# Altium footprint library mastermind.PCBLIB: 1061 footprints (part 54 of 67)
Each footprint in its own frame and in the unit in brackets; x right, y up, seen from the top. Pads: shape width x height; smd on the part's side, far side on the other; paste and mask are expansions set on the pad; w line width, h text height; cw(c..) or ccw(c..) is an arc to the next point about the centre after c.
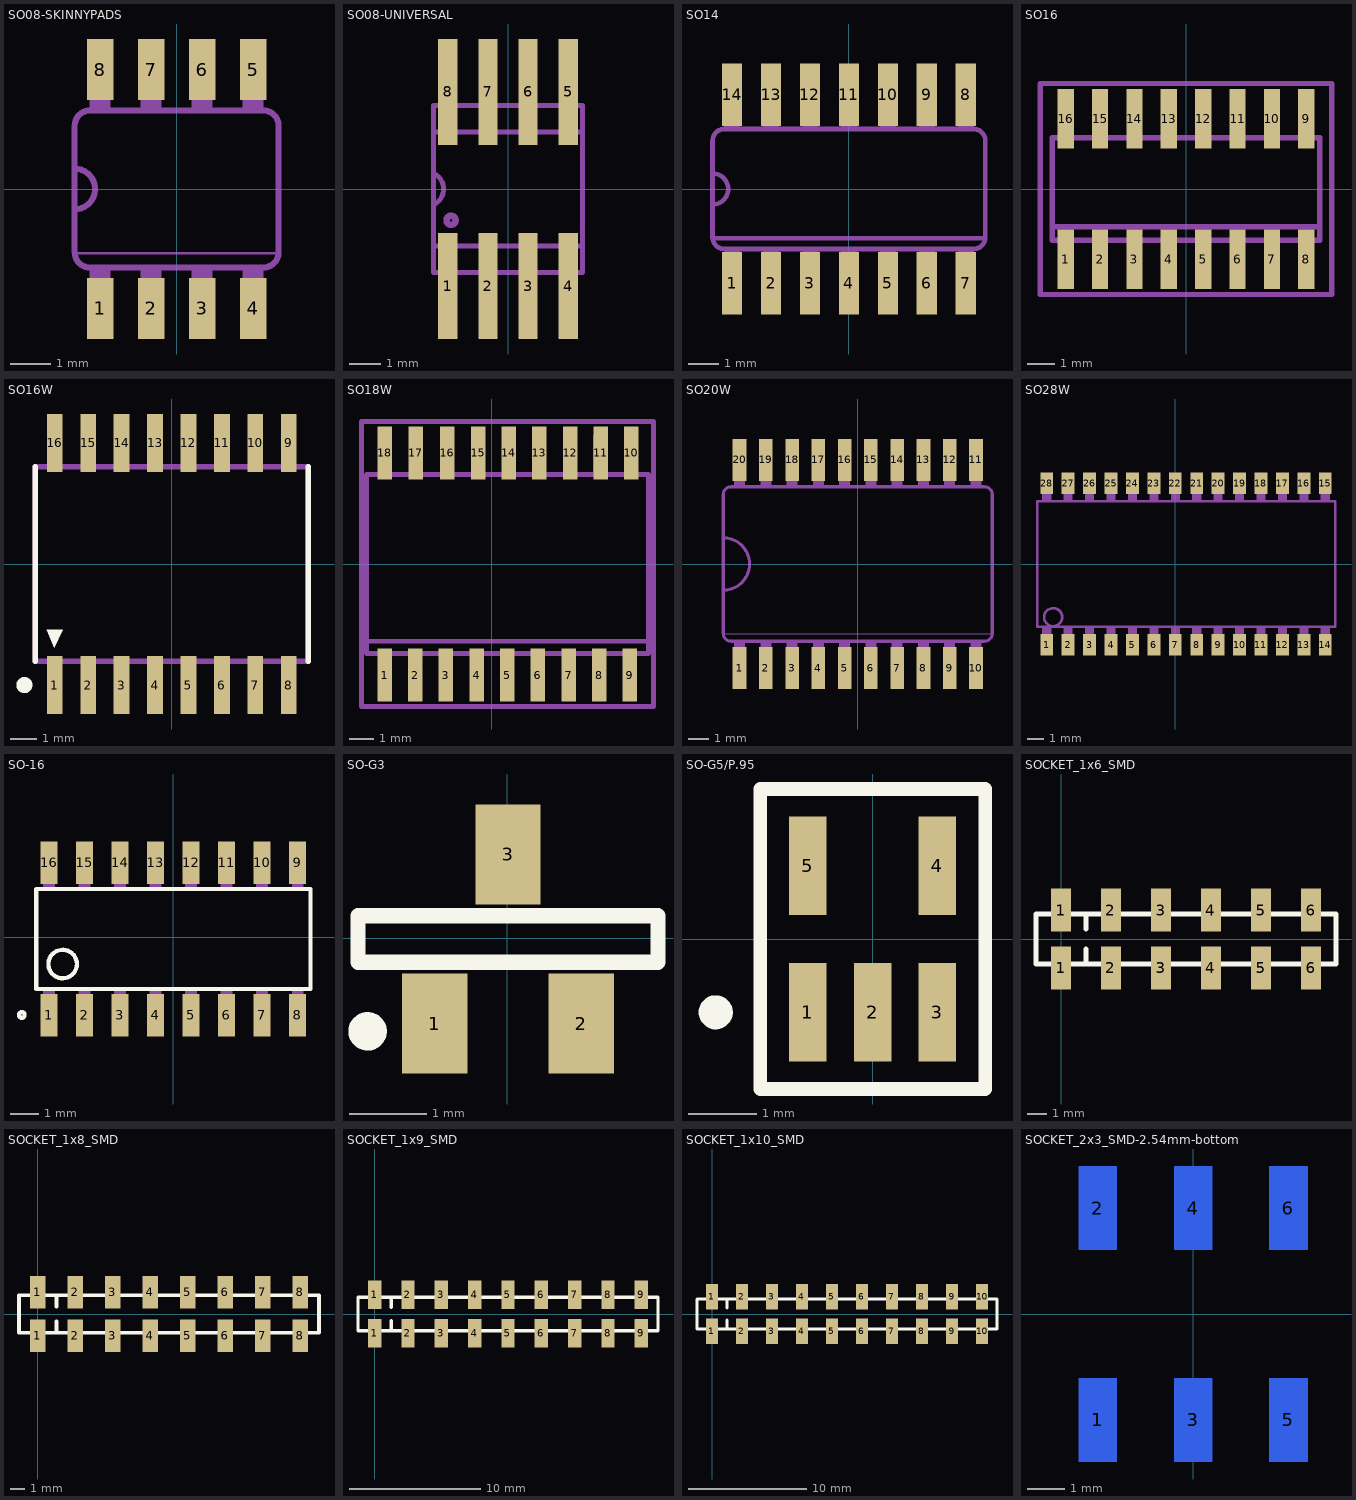
[diagram p53: the footprints below, top view; thin cyan lines are the x and y axes]

## SO08-SKINNYPADS [mil]
pads (8):
  rect 26x60 smd: 1(-75,-117.06) 2(-25,-117.06) 3(25,-117.06) 4(75,-117.06) 5(75,117.06) 6(25,117.06) 7(-25,117.06) 8(-75,117.06)
Mechanical 2:
  lines w2: -100,-63 100,-63
  lines w6: -100,-20 ccw(c-100,0) -100,20 ; -100,-62 ccw(c-85,-62) -85,-77 85,-77 ccw(c85,-62) 100,-62 100,62 ccw(c85,62) 85,77 -85,77 ccw(c-85,62) -100,62 -100,-62
Mechanical 8:
  region: -85,77 -85,122 -65,122 -65,77
  region: -35,77 -35,122 -15,122 -15,77
  region: 15,77 15,122 35,122 35,77
  region: 65,-122 65,-77 85,-77 85,-122
  region: 15,-121 15,-76 35,-76 35,-121
  region: -35,-122 -35,-77 -15,-77 -15,-122
  region: -85,-122 -85,-77 -65,-77 -65,-122
  region: 65,77 65,122 85,122 85,77

## SO08-UNIVERSAL [mil] "SO08-UNIVERSAL"
pads (8):
  rect 24x132 smd: 1(-75,-121) 2(-25,-121) 3(25,-121) 4(75,-121) 5(75,121) 6(25,121) 7(-25,121) 8(-75,121)
Mechanical 3:
  region: 68,73 68,157 82,157 82,73
  region: 18,73 18,157 32,157 32,73
  region: -32,73 -32,157 -18,157 -18,73
  region: -82,73 -82,157 -68,157 -68,73
  region: 68,-157 68,-73 82,-73 82,-157
  region: 18,-157 18,-73 32,-73 32,-157
  region: -32,-157 -32,-73 -18,-73 -18,-157
  region: -82,-157 -82,-73 -68,-73 -68,-157
  lines w6: -92.99,70.98 92.99,70.98 ; -92.99,-70.98 -92.99,-104 92.99,-104 92.99,-70.98 ; -92.99,-70.98 -92.99,104 92.99,104 92.99,-70.98 ; -92.99,-70.98 92.99,-70.98
Dimensions:
  circle w8: c-71,-39 r5.65
  lines w6: -92.99,-70.98 -92.99,-19.57 ; -92.99,19.57 -92.99,70.98 ; -92.52,-19.69 ccw(c-102.36,0) -92.52,19.69 ; -57.09,-70.87 -43.31,-70.87 ; -57.09,70.87 -43.31,70.87 ; -7.87,-70.87 7.87,-70.87 ; -7.87,70.87 7.87,70.87 ; 43.31,-70.87 57.09,-70.87 ; 43.31,70.87 57.09,70.87 ; 92.99,-70.98 92.99,70.98
3D body: height 50, standoff 0, extent -87,55 -63,187
3D body: height 50, standoff 0, extent -37,55 -13,187
3D body: height 50, standoff 0, extent 13,55 37,187
3D body: height 50, standoff 0, extent 63,55 87,187
3D body: height 50, standoff 0, extent 63,-187 87,-55
3D body: height 50, standoff 0, extent 13,-187 37,-55
3D body: height 50, standoff 0, extent -37,-187 -13,-55
3D body: height 50, standoff 0, extent -87,-187 -63,-55
3D body: height 150, standoff 0, extent 68,73 82,157
3D body: height 150, standoff 0, extent 18,73 32,157
3D body: height 150, standoff 0, extent -32,73 -18,157
3D body: height 150, standoff 0, extent -82,73 -68,157
3D body: height 150, standoff 0, extent 68,-157 82,-73
3D body: height 150, standoff 0, extent 18,-157 32,-73
3D body: height 150, standoff 0, extent -32,-157 -18,-73
3D body: height 150, standoff 0, extent -82,-157 -68,-73
3D body: height 150, standoff 0, extent 89.74,-107.25 96.24,-67.73
3D body: height 150, standoff 0, extent 89.74,-74.23 96.24,107.25
3D body: height 150, standoff 0, extent -96.24,-107.25 -89.74,-67.73
3D body: height 150, standoff 0, extent -96.24,-74.23 -89.74,107.25
3D body: height 150, standoff 0, extent -96.24,-107.25 96.24,-100.75
3D body: height 150, standoff 0, extent -96.24,100.75 96.24,107.25
3D body: height 150, standoff 0, extent -96.24,67.73 96.24,74.23
3D body: height 150, standoff 0, extent -96.24,-74.23 96.24,-67.73

## SO14 [mil]
pads (14):
  rect 26x80 smd: 1(-150,-121) 2(-100,-121) 3(-50,-121) 4(0,-121) 5(50,-121) 6(100,-121) 7(150,-121) 8(150,121) 9(100,121) 10(50,121) 11(0,121) 12(-50,121) 13(-100,121) 14(-150,121)
Mechanical 2:
  lines w6: -175,-63 175,-63 ; -175,-20 ccw(c-175,0) -175,20 ; -175,-20 -175,20 ; -175,-20 -175,-62 ccw(c-160,-62) -160,-77 160,-77 ccw(c160,-62) 175,-62 175,62 ccw(c160,62) 160,77 -160,77 ccw(c-160,62) -175,62 -175,20
Mechanical 8:
  region: -10,77 -10,122 10,122 10,77
  region: -160,-122 -160,-77 -140,-77 -140,-122
  region: -110,-122 -110,-77 -90,-77 -90,-122
  region: -60,-121 -60,-76 -40,-76 -40,-121
  region: -10,-122 -10,-77 10,-77 10,-122
  region: -60,77 -60,122 -40,122 -40,77
  region: -110,77 -110,122 -90,122 -90,77
  region: -160,77 -160,122 -140,122 -140,77
  region: 40,77 40,122 60,122 60,77
  region: 90,77 90,122 110,122 110,77
  region: 140,77 140,122 160,122 160,77
  region: 40,-122 40,-77 60,-77 60,-122
  region: 90,-122 90,-77 110,-77 110,-122
  region: 140,-122 140,-77 160,-77 160,-122

## SO16 [mm]
pads (16):
  rect 0.6x2.2 smd: 1(-4.445,-2.6) 2(-3.175,-2.6) 3(-1.905,-2.6) 4(-0.635,-2.6) 5(0.635,-2.6) 6(1.905,-2.6) 7(3.175,-2.6) 8(4.445,-2.6) 9(4.445,2.6) 10(3.175,2.6) 11(1.905,2.6) 12(0.635,2.6) 13(-0.635,2.6) 14(-1.905,2.6) 15(-3.175,2.6) 16(-4.445,2.6)
Mechanical 8:
  region: -4.69,2 -4.69,3.1 -4.2,3.1 -4.2,2
  region: -3.42,2 -3.42,3.1 -2.93,3.1 -2.93,2
  region: 2.93,2 2.93,3.1 3.42,3.1 3.42,2
  region: 4.2,2 4.2,3.1 4.69,3.1 4.69,2
  region: 4.2,-3.1 4.2,-2 4.69,-2 4.69,-3.1
  region: 2.93,-3.1 2.93,-2 3.42,-2 3.42,-3.1
  region: 1.66,-3.1 1.66,-2 2.15,-2 2.15,-3.1
  region: 0.39,-3.1 0.39,-2 0.88,-2 0.88,-3.1
  region: -2.15,2 -2.15,3.1 -1.66,3.1 -1.66,2
  region: -0.88,2 -0.88,3.1 -0.39,3.1 -0.39,2
  region: 0.39,2 0.39,3.1 0.88,3.1 0.88,2
  region: 1.66,2 1.66,3.1 2.15,3.1 2.15,2
  region: -0.88,-3.1 -0.88,-2 -0.39,-2 -0.39,-3.1
  region: -2.15,-3.1 -2.15,-2 -1.66,-2 -1.66,-3.1
  region: -3.42,-3.1 -3.42,-2 -2.93,-2 -2.93,-3.1
  region: -4.69,-3.1 -4.69,-2 -4.2,-2 -4.2,-3.1
  lines w0.203: -4.94,-1.4 4.94,-1.4 ; -4.94,-1.4 -4.94,1.9 4.94,1.9 4.94,-1.4 ; -4.94,-1.4 -4.94,-1.9 4.94,-1.9 4.94,-1.4
Mechanical 29 (Mech34):
  lines w0.2: -5.395,-3.9 -5.395,3.9 5.395,3.9 5.395,-3.9 -5.395,-3.9

## SO16W [mm]
pads (16):
  rect 0.6x2.2 smd: 1(-4.445,-4.6) 2(-3.175,-4.6) 3(-1.905,-4.6) 4(-0.635,-4.6) 5(0.635,-4.6) 6(1.905,-4.6) 7(3.175,-4.6) 8(4.445,-4.6) 9(4.445,4.6) 10(3.175,4.6) 11(1.905,4.6) 12(0.635,4.6) 13(-0.635,4.6) 14(-1.905,4.6) 15(-3.175,4.6) 16(-4.445,4.6)
Top Overlay:
  circle w0.3: c-5.6,-4.6 r0.156
  region: -4.745,-2.5 -4.144,-2.5 -4.457,-3.176
  lines w0.2: -5.19,-3.7 -5.19,-0.536 -5.19,3.7 ; 5.19,-3.7 5.19,3.7
Mechanical 13:
  region: -4.2,-5.328 -4.697,-5.328 -4.697,-3.8 -4.2,-3.8
  region: -2.93,-5.33 -3.426,-5.33 -3.426,-3.8 -2.93,-3.8
  region: -1.66,-5.33 -2.154,-5.33 -2.154,-3.8 -1.66,-3.8
  region: -0.39,-5.33 -0.882,-5.33 -0.882,-3.8 -0.39,-3.8
  region: 0.88,-5.326 0.39,-5.326 0.39,-3.8 0.88,-3.8
  region: 2.15,-5.322 1.661,-5.322 1.661,-3.8 2.15,-3.8
  region: 3.42,-5.33 2.935,-5.33 2.935,-3.8 3.42,-3.8
  region: 4.69,-5.322 4.201,-5.322 4.201,-3.8 4.69,-3.8
  region: 4.69,3.803 4.203,3.803 4.203,5.32 4.69,5.32
  region: 3.42,3.803 2.932,3.803 2.932,5.32 3.42,5.32
  region: 2.15,3.804 1.662,3.804 1.662,5.32 2.15,5.32
  region: 0.88,3.803 0.39,3.803 0.39,5.32 0.88,5.32
  region: -0.39,3.801 -0.88,3.801 -0.88,5.32 -0.39,5.32
  region: -1.66,3.804 -2.152,3.804 -2.152,5.32 -1.66,5.32
  region: -2.93,3.805 -3.424,3.805 -3.424,5.32 -2.93,5.32
  region: -4.2,3.806 -4.697,3.806 -4.697,5.32 -4.2,5.32
  lines w0.203: -5.19,-3.7 5.19,-3.7 5.19,-3.2 5.19,3.7 -5.19,3.7 -5.19,-3.2 -5.19,-3.7
3D body "SO16 Wide 7.50mm.step": height 2.65, standoff 0, extent -5.15,-5.25 5.15,5.05

## SO18W [mm]
pads (18):
  rect 0.6x2.2 smd: 1(-4.445,-4.6) 2(-3.175,-4.6) 3(-1.905,-4.6) 4(-0.635,-4.6) 5(0.635,-4.6) 6(1.905,-4.6) 7(3.175,-4.6) 8(4.445,-4.6) 9(5.715,-4.6) 10(5.775,4.6) 11(4.505,4.6) 12(3.235,4.6) 13(1.965,4.6) 14(0.695,4.6) 15(-0.575,4.6) 16(-1.845,4.6) 17(-3.145,4.6) 18(-4.445,4.6)
Mechanical 8:
  region: 5.47,-5.32 5.47,-3.8 5.96,-3.8 5.96,-5.32
  region: -4.69,3.8 -4.69,5.32 -4.2,5.32 -4.2,3.8
  region: -3.39,3.8 -3.39,5.32 -2.9,5.32 -2.9,3.8
  region: -2.12,3.8 -2.12,5.32 -1.63,5.32 -1.63,3.8
  region: -0.85,3.8 -0.85,5.32 -0.36,5.32 -0.36,3.8
  region: 0.42,3.8 0.42,5.32 0.91,5.32 0.91,3.8
  region: 1.69,3.8 1.69,5.32 2.18,5.32 2.18,3.8
  region: 2.96,3.8 2.96,5.32 3.45,5.32 3.45,3.8
  region: 4.2,3.8 4.2,5.32 4.69,5.32 4.69,3.8
  region: 5.47,3.8 5.47,5.32 5.96,5.32 5.96,3.8
  region: 4.2,-5.32 4.2,-3.8 4.69,-3.8 4.69,-5.32
  region: 2.93,-5.32 2.93,-3.8 3.42,-3.8 3.42,-5.32
  region: 1.66,-5.32 1.66,-3.8 2.15,-3.8 2.15,-5.32
  region: 0.39,-5.32 0.39,-3.8 0.88,-3.8 0.88,-5.32
  region: -0.88,-5.32 -0.88,-3.8 -0.39,-3.8 -0.39,-5.32
  region: -2.15,-5.32 -2.15,-3.8 -1.66,-3.8 -1.66,-5.32
  region: -3.42,-5.32 -3.42,-3.8 -2.93,-3.8 -2.93,-5.32
  region: -4.69,-5.32 -4.69,-3.8 -4.2,-3.8 -4.2,-5.32
  lines w0.203: -5.19,-3.2 6.49,-3.2 ; -5.19,-3.2 -5.19,3.7 6.49,3.7 6.49,-3.2 ; -5.19,-3.2 -5.19,-3.7 6.49,-3.7 6.49,-3.2
Mechanical 29 (Mech34):
  lines w0.2: -5.395,-5.9 -5.395,5.9 6.695,5.9 6.695,-5.9 -5.395,-5.9

## SO20W [mil]
pads (20):
  rect 26x80 smd: 1(-225,-198) 2(-175,-198) 3(-125,-198) 4(-75,-198) 5(-25,-198) 6(25,-198) 7(75,-198) 8(125,-198) 9(175,-198) 10(225,-198) 11(225,198) 12(175,198) 13(125,198) 14(75,198) 15(25,198) 16(-25,198) 17(-75,198) 18(-125,198) 19(-175,198) 20(-225,198)
Mechanical 2:
  region: 215,-152 215,-147 235,-147 235,-152
  region: 165,-152 165,-147 185,-147 185,-152
  region: 215,147 215,152 235,152 235,147
  region: 165,147 165,152 185,152 185,147
  region: 115,147 115,152 135,152 135,147
  region: 65,147 65,152 85,152 85,147
  region: 15,147 15,152 35,152 35,147
  region: -35,147 -35,152 -15,152 -15,147
  region: -85,147 -85,152 -65,152 -65,147
  region: -135,147 -135,152 -115,152 -115,147
  region: -185,147 -185,152 -165,152 -165,147
  region: -235,147 -235,152 -215,152 -215,147
  region: 115,-152 115,-147 135,-147 135,-152
  region: 65,-152 65,-147 85,-147 85,-152
  region: 15,-152 15,-147 35,-147 35,-152
  region: -35,-152 -35,-147 -15,-147 -15,-152
  region: -85,-152 -85,-147 -65,-147 -65,-152
  region: -135,-152 -135,-147 -115,-147 -115,-152
  region: -185,-152 -185,-147 -165,-147 -165,-152
  region: -235,-152 -235,-147 -215,-147 -215,-152
  lines w2: -255,-133 255,-133
  lines w6: -256,-50 ccw(c-256,0) -256,50 ; -256,-50 -256,-132 ccw(c-241,-132) -241,-147 241,-147 ccw(c241,-132) 256,-132 256,132 ccw(c241,132) 241,147 -241,147 ccw(c-241,132) -256,132 -256,50 ; -256,-50 -256,50
Mechanical 8:
  region: 215,-210 215,-152 235,-152 235,-210
  region: 165,-210 165,-152 185,-152 185,-210
  region: 215,152 215,210 235,210 235,152
  region: 165,152 165,210 185,210 185,152
  region: 115,152 115,210 135,210 135,152
  region: 65,152 65,210 85,210 85,152
  region: 15,152 15,210 35,210 35,152
  region: -35,152 -35,210 -15,210 -15,152
  region: -85,152 -85,210 -65,210 -65,152
  region: -135,152 -135,210 -115,210 -115,152
  region: -185,152 -185,210 -165,210 -165,152
  region: -235,152 -235,210 -215,210 -215,152
  region: 115,-210 115,-152 135,-152 135,-210
  region: 65,-210 65,-152 85,-152 85,-210
  region: 15,-210 15,-152 35,-152 35,-210
  region: -35,-210 -35,-152 -15,-152 -15,-210
  region: -85,-210 -85,-152 -65,-152 -65,-210
  region: -135,-210 -135,-152 -115,-152 -115,-210
  region: -185,-210 -185,-152 -165,-152 -165,-210
  region: -235,-210 -235,-152 -215,-152 -215,-210

## SO28W [mil]
pads (28):
  rect 30x50 smd: 1(-300,-188.19) 2(-250,-188.19) 3(-200,-188.19) 4(-150,-188.19) 5(-100,-188.19) 6(-50,-188.19) 7(0,-188.19) 8(50,-188.19) 9(100,-188.19) 10(150,-188.19) 11(200,-188.19) 12(250,-188.19) 13(300,-188.19) 14(350,-188.19) 15(350,188.19) 16(300,188.19) 17(250,188.19) 18(200,188.19) 19(150,188.19) 20(100,188.19) 21(50,188.19) 22(0,188.19) 23(-50,188.19) 24(-100,188.19) 25(-150,188.19) 26(-200,188.19) 27(-250,188.19) 28(-300,188.19)
Mechanical 2:
  circle w6: c-285,-124 r21
  lines w6: -322,-146.19 -322,146.19 373,146.19 373,-146.19 -322,-146.19
Mechanical 8:
  region: -310,147.19 -310,207.19 -290,207.19 -290,147.19
  region: -260,147.19 -260,207.19 -240,207.19 -240,147.19
  region: -210,147.19 -210,207.19 -190,207.19 -190,147.19
  region: -160,147.19 -160,207.19 -140,207.19 -140,147.19
  region: -110,147.19 -110,207.19 -90,207.19 -90,147.19
  region: -60,147.19 -60,207.19 -40,207.19 -40,147.19
  region: -10,147.19 -10,207.19 10,207.19 10,147.19
  region: 40,147.19 40,207.19 60,207.19 60,147.19
  region: 90,147.19 90,207.19 110,207.19 110,147.19
  region: 140,147.19 140,207.19 160,207.19 160,147.19
  region: 190,147.19 190,207.19 210,207.19 210,147.19
  region: 240,147.19 240,207.19 260,207.19 260,147.19
  region: 290,147.19 290,207.19 310,207.19 310,147.19
  region: 340,147.19 340,207.19 360,207.19 360,147.19
  region: 340,-207.19 340,-147.19 360,-147.19 360,-207.19
  region: 290,-207.19 290,-147.19 310,-147.19 310,-207.19
  region: 240,-207.19 240,-147.19 260,-147.19 260,-207.19
  region: 190,-207.19 190,-147.19 210,-147.19 210,-207.19
  region: 140,-207.19 140,-147.19 160,-147.19 160,-207.19
  region: 90,-207.19 90,-147.19 110,-147.19 110,-207.19
  region: 40,-207.19 40,-147.19 60,-147.19 60,-207.19
  region: -10,-207.19 -10,-147.19 10,-147.19 10,-207.19
  region: -60,-207.19 -60,-147.19 -40,-147.19 -40,-207.19
  region: -110,-207.19 -110,-147.19 -90,-147.19 -90,-207.19
  region: -160,-207.19 -160,-147.19 -140,-147.19 -140,-207.19
  region: -210,-207.19 -210,-147.19 -190,-147.19 -190,-207.19
  region: -260,-207.19 -260,-147.19 -240,-147.19 -240,-207.19
  region: -310,-207.19 -310,-147.19 -290,-147.19 -290,-207.19

## SO-16 [mil]
pads (16):
  rect 24x60 smd: 1(-175,-110) 2(-125,-110) 3(-75,-110) 4(-25,-110) 5(25,-110) 6(75,-110) 7(125,-110) 8(175,-110) 9(175,105) 10(125,105) 11(75,105) 12(25,105) 13(-25,105) 14(-75,105) 15(-125,105) 16(-175,105)
Top Overlay:
  circle w6: c-213.39,-109.45 r3.94
  circle w6: c-155.91,-37.8 r20.08
  lines w6: -193,-73 -193,68 193,68 193,-73 -193,-73
Mechanical 3:
  region: 167,-114 167,-74 183,-74 183,-114
  region: 117,-114 117,-74 133,-74 133,-114
  region: 67,-114 67,-74 83,-74 83,-114
  region: 17,-114 17,-74 33,-74 33,-114
  region: -33,-114 -33,-74 -17,-74 -17,-114
  region: -83,-114 -83,-74 -67,-74 -67,-114
  region: -133,-114 -133,-74 -117,-74 -117,-114
  region: -183,-114 -183,-74 -167,-74 -167,-114
  region: -183,69 -183,109 -167,109 -167,69
  region: -133,69 -133,109 -117,109 -117,69
  region: -83,69 -83,109 -67,109 -67,69
  region: -33,69 -33,109 -17,109 -17,69
  region: 17,69 17,109 33,109 33,69
  region: 67,69 67,109 83,109 83,69
  region: 117,69 117,109 133,109 133,69
  region: 167,69 167,109 183,109 183,69
3D body "SO16 Narrow 3.9mm.step": height 53.15, standoff 0, extent -194.88,-117.71 194.89,117.72

## SO-G3 [mm]
pads (3):
  rect 0.85x1.3 smd: 1(-0.939,-1.107) 2(0.961,-1.107) 3(0.011,1.093)
Top Overlay:
  circle w0.25: c-1.814,-1.207 r0.125
  lines w0.2: -1.939,-0.307 -1.939,0.293 1.961,0.293 1.961,-0.307 -1.939,-0.307
3D body: height 0.51, standoff 0, extent -0.293,0.621 0.342,1.51
3D body: height 0.51, standoff 0, extent 0.63,-1.524 1.265,-0.635
3D body: height 0.51, standoff 0, extent -1.27,-1.524 -0.635,-0.635
3D body: height 2.54, standoff 0, extent -1.651,-0.635 1.651,0.635

## SO-G5/P.95 [mm]
pads (5):
  rect 0.55x1.45 smd: 1(-0.954,-1.07) 2(-0.004,-1.07) 3(0.946,-1.07) 4(0.946,1.08) 5(-0.954,1.08)
Top Overlay:
  circle w0.25: c-2.304,-1.07 r0.125
  lines w0.2: -1.654,-2.195 -1.654,2.205 1.646,2.205 1.646,-2.195 -1.654,-2.195
3D body: height 0.89, standoff 0, extent -1.27,-1.778 1.27,1.778

## SOCKET_1x6_SMD [mm]
pads (12):
  rect 1.02x2.19 smd: 1(0,-1.465) 1(0,1.465) 2(2.54,-1.465) 2(2.54,1.465) 3(5.08,-1.465) 3(5.08,1.465) 4(7.62,-1.465) 4(7.62,1.465) 5(10.16,-1.465) 5(10.16,1.465) 6(12.7,1.465) 6(12.7,-1.465)
Top Overlay:
  lines w0.254: 1.27,-1.27 1.27,-0.508 ; 1.27,0.508 1.27,1.27 ; -1.27,-1.27 -1.27,1.27 13.97,1.27 13.97,-1.27 -1.27,-1.27
3D body "Samtec-SSM-106-L-SV.step": height 7.47, standoff -0.03, extent -1.27,-2.286 13.97,2.286

## SOCKET_1x8_SMD [mm]
pads (16):
  rect 1.02x2.19 smd: 1(0,-1.465) 1(0,1.465) 2(2.54,-1.465) 2(2.54,1.465) 3(5.08,-1.465) 3(5.08,1.465) 4(7.62,-1.465) 4(7.62,1.465) 5(10.16,-1.465) 5(10.16,1.465) 6(12.7,1.465) 6(12.7,-1.465) 7(15.24,-1.465) 7(15.24,1.465) 8(17.78,-1.465) 8(17.78,1.465)
Top Overlay:
  lines w0.254: 1.27,-1.27 1.27,-0.508 ; 1.27,0.508 1.27,1.27 ; -1.27,-1.27 19.05,-1.27 19.05,1.27 -1.27,1.27 -1.27,-1.27
3D body "Samtec-SSM-108-L-SV.step": height 7.47, standoff -0.03, extent -1.27,-2.286 19.05,2.286

## SOCKET_1x9_SMD [mm]
pads (18):
  rect 1.02x2.19 smd: 1(0,-1.465) 1(0,1.465) 2(2.54,-1.465) 2(2.54,1.465) 3(5.08,-1.465) 3(5.08,1.465) 4(7.62,-1.465) 4(7.62,1.465) 5(10.16,-1.465) 5(10.16,1.465) 6(12.7,1.465) 6(12.7,-1.465) 7(15.24,-1.465) 7(15.24,1.465) 8(17.78,-1.465) 8(17.78,1.465) 9(20.32,-1.465) 9(20.32,1.465)
Top Overlay:
  lines w0.254: 1.27,-1.27 1.27,-0.508 ; 1.27,0.508 1.27,1.27 ; -1.27,-1.27 -1.27,1.27 21.59,1.27 21.59,-1.27 -1.27,-1.27
3D body "Samtec-SSM-109-L-SV.step": height 7.47, standoff 0.05, extent -1.26,-2.297 21.6,2.275

## SOCKET_1x10_SMD [mm]
pads (20):
  rect 1.02x2.19 smd: 1(0,-1.465) 1(0,1.465) 2(2.54,-1.465) 2(2.54,1.465) 3(5.08,-1.465) 3(5.08,1.465) 4(7.62,-1.465) 4(7.62,1.465) 5(10.16,-1.465) 5(10.16,1.465) 6(12.7,-1.465) 6(12.7,1.465) 7(15.24,-1.465) 7(15.24,1.465) 8(17.78,-1.465) 8(17.78,1.465) 9(20.32,-1.465) 9(20.32,1.465) 10(22.86,-1.465) 10(22.86,1.465)
Top Overlay:
  lines w0.254: 1.27,-1.27 1.27,-0.508 ; 1.27,0.508 1.27,1.27 ; -1.27,-1.27 24.13,-1.27 24.13,1.27 -1.27,1.27 -1.27,-1.27
3D body "Samtec-SSM-110-L-SV.step": height 7.47, standoff -0.03, extent -1.27,-2.286 24.13,2.286

## SOCKET_2x3_SMD-2.54mm-bottom [mm]
pads (6):
  rect 1.02x2.22 smd far side: 1(-2.54,-2.825) 2(-2.54,2.825) 3(0,-2.825) 4(0,2.825) 5(2.54,-2.825) 6(2.54,2.825)
Bottom Overlay:
  circle w0.508: c-3.936,-3.48 r0.254
  lines w0.254: -3.33,-2.54 -3.81,-2.54 -3.81,2.54 -3.33,2.54 ; -1.77,-2.54 -0.78,-2.54 ; -1.77,2.54 -0.78,2.54 ; 0.78,-2.54 1.77,-2.54 ; 0.78,2.54 1.77,2.54 ; 3.33,-2.54 3.81,-2.54 3.81,2.54 3.33,2.54